# Altium footprint library PedalControl.PcbLib: 12 footprints
Each footprint in its own frame and in the unit in brackets; x right, y up, seen from the top. Pads: shape width x height; smd on the part's side, far side on the other; paste and mask are expansions set on the pad; w line width, h text height; cw(c..) or ccw(c..) is an arc to the next point about the centre after c.
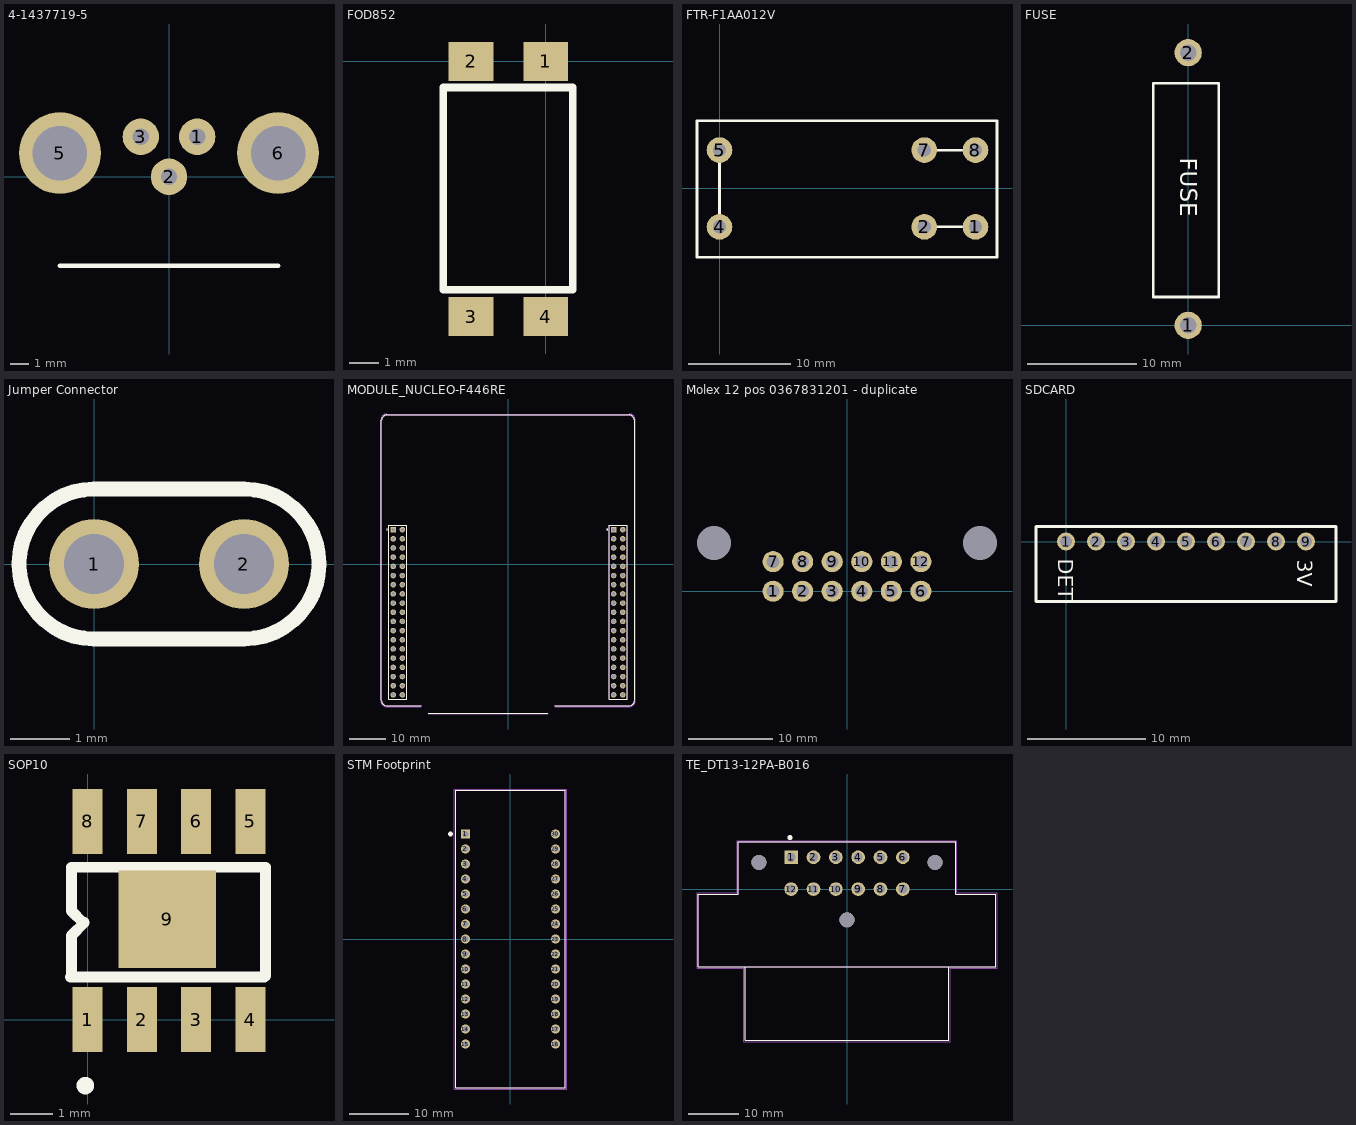
[diagram p0: the footprints below, top view; thin cyan lines are the x and y axes]

## 4-1437719-5 [mm]
pads (5):
  round 2 hole 0.9: 1(1.55,2.2) 2(0,0) 3(-1.55,2.2)
  round 4.5 hole 3: 5(-6,1.3) 6(6,1.3)
Top Overlay:
  lines w0.254: -6,-4.9 6,-4.9
3D body "c-4-1437719-5-a color.stp": height 16.08, standoff -2.9, extent -7.497,-19.3 7.497,6.6

## ADP7142ARDZ-5.0 [mm]

## FOD852 [mm]
pads (4):
  rect 1.5x1.3 smd: 1(0,0) 2(-2.5,0) 3(-2.5,-8.55) 4(0,-8.55)
Top Overlay:
  lines w0.254: -3.425,-7.65 0.9,-7.65 0.9,-0.875 -3.425,-0.875 -3.425,-7.65
3D body "DIP4 Gullwing.STEP": height 3.6, standoff 0, extent -3.6,-9.125 1,0.475

## FTR-F1AA012V [mm]
pads (6):
  round 2.5 hole 1.3: 1(25,-3.75) 2(20,-3.75) 4(0,-3.75) 5(0,3.75) 7(20,3.75) 8(25,3.75)
Top Overlay:
  lines w0.254: 0,-3.75 0,3.75 ; 20,-3.75 25,-3.75 ; 20,3.75 25,3.75 ; -2.2,-6.7 27.1,-6.7 27.1,6.6 -2.2,6.6 -2.2,-6.7
3D body "FTR-F1AA012V.stp": height 16.5, standoff -3.3, extent -2.1,-6.55 26.9,6.55

## FUSE [mm]
pads (2):
  round 2.5 hole 1.5: 1(0,0) 2(0,25)
Top Overlay:
  lines w0.254: -3.2,2.6 2.8,2.6 2.8,22.2 -3.2,22.2 -3.2,2.6
  text "FUSE" at -0.746,15.346 h1.52
3D body "Fuse.stp": height 5.59, standoff -1.71, extent -2.587,-0.399 2.587,25.499

## Jumper Connector [mil]
pads (2):
  round 60 hole 40 unplated: 1(0,0) 2(100,0)
Top Overlay:
  lines w10: -50,0 cw(c0,0) 0,50 100,50 cw(c100,0) 150,0 cw(c100,0) 100,-50 0,-50 cw(c0,0) -50,0

## MODULE_NUCLEO-F446RE [mm]
pads (76):
  rect 1.53x1.53 hole 1.02: CN7_1(-31.75,9.51) CN10_1(29.21,9.51)
  round 1.53 hole 1.02: CN7_2(-29.21,9.51) CN7_3(-31.75,6.97) CN7_4(-29.21,6.97) CN7_5(-31.75,4.43) CN7_6(-29.21,4.43) CN7_7(-31.75,1.89) CN7_8(-29.21,1.89) CN7_9(-31.75,-0.65) CN7_10(-29.21,-0.65) CN7_11(-31.75,-3.19) CN7_12(-29.21,-3.19) CN7_13(-31.75,-5.73) CN7_14(-29.21,-5.73) CN7_15(-31.75,-8.27) CN7_16(-29.21,-8.27) CN7_17(-31.75,-10.81) CN7_18(-29.21,-10.81) CN7_19(-31.75,-13.35) CN7_20(-29.21,-13.35) CN7_21(-31.75,-15.89) CN7_22(-29.21,-15.89) CN7_23(-31.75,-18.43) CN7_24(-29.21,-18.43) CN7_25(-31.75,-20.97) CN7_26(-29.21,-20.97) CN7_27(-31.75,-23.51) CN7_28(-29.21,-23.51) CN7_29(-31.75,-26.05) CN7_30(-29.21,-26.05) CN7_31(-31.75,-28.59) CN7_32(-29.21,-28.59) CN7_33(-31.75,-31.13) CN7_34(-29.21,-31.13) CN7_35(-31.75,-33.67) CN7_36(-29.21,-33.67) CN7_37(-31.75,-36.21) CN7_38(-29.21,-36.21) CN10_2(31.75,9.51) CN10_3(29.21,6.97) CN10_4(31.75,6.97) CN10_5(29.21,4.43) CN10_6(31.75,4.43) CN10_7(29.21,1.89) CN10_8(31.75,1.89) CN10_9(29.21,-0.65) CN10_10(31.75,-0.65) CN10_11(29.21,-3.19) CN10_12(31.75,-3.19) CN10_13(29.21,-5.73) CN10_14(31.75,-5.73) CN10_15(29.21,-8.27) CN10_16(31.75,-8.27) CN10_17(29.21,-10.81) CN10_18(31.75,-10.81) CN10_19(29.21,-13.35) CN10_20(31.75,-13.35) CN10_21(29.21,-15.89) CN10_22(31.75,-15.89) CN10_23(29.21,-18.43) CN10_24(31.75,-18.43) CN10_25(29.21,-20.97) CN10_26(31.75,-20.97) CN10_27(29.21,-23.51) CN10_28(31.75,-23.51) CN10_29(29.21,-26.05) CN10_30(31.75,-26.05) CN10_31(29.21,-28.59) CN10_32(31.75,-28.59) CN10_33(29.21,-31.13) CN10_34(31.75,-31.13) CN10_35(29.21,-33.67) CN10_36(31.75,-33.67) CN10_37(29.21,-36.21) CN10_38(31.75,-36.21)
Top Overlay:
  circle w0.2: c27.46,9.51 r0.1
  circle w0.2: c-33.5,9.51 r0.1
  lines w0.127: -24,-39.25 -33.5,-39.25 cw(c-33.5,-37.75) -35,-37.75 -35,39.75 cw(c-33.5,39.75) -33.5,41.25 33.5,41.25 cw(c33.5,39.75) 35,39.75 35,-37.75 cw(c33.5,-37.75) 33.5,-39.25 13,-39.25 ; -22,-41.25 11,-41.25 ; -32.98,-37.48 -27.98,-37.48 -27.98,10.78 -32.98,10.78 -32.98,-37.48 ; 27.98,-37.48 32.98,-37.48 32.98,10.78 27.98,10.78 27.98,-37.48
Mechanical 13:
  circle w0.2: c27.46,9.51 r0.1
  circle w0.2: c-33.5,9.51 r0.1
  lines w0.127: -24,-39.25 -33.5,-39.25 cw(c-33.5,-37.75) -35,-37.75 -35,39.75 cw(c-33.5,39.75) -33.5,41.25 33.5,41.25 cw(c33.5,39.75) 35,39.75 35,-37.75 cw(c33.5,-37.75) 33.5,-39.25 13,-39.25 ; -22,-41.25 11,-41.25 ; -32.98,-37.48 -27.98,-37.48 -27.98,10.78 -32.98,10.78 -32.98,-37.48 ; 27.98,-37.48 32.98,-37.48 32.98,10.78 27.98,10.78 27.98,-37.48
Mechanical 15:
  lines w0.05: -24.125,-39.5 -33.5,-39.5 cw(c-33.5,-37.75) -35.25,-37.75 -35.25,39.75 cw(c-33.5,39.75) -33.5,41.5 33.5,41.5 cw(c33.5,39.75) 35.25,39.75 35.25,-37.75 cw(c33.5,-37.75) 33.5,-39.5 13.125,-39.5 ; -22.125,-41.5 11.125,-41.5
3D body "step_temp.STEP": height 14.82, standoff -5.88, extent -35,-41.25 35,42.7

## Molex 12 pos 0367831201 - duplicate [mm]
pads (14):
  round 2.5 hole 1.5: 1(-8.75,0) 2(-5.25,0) 3(-1.75,0) 4(1.75,0) 5(5.25,0) 6(8.75,0) 7(-8.75,3.5) 8(-5.25,3.5) 9(-1.75,3.5) 10(1.75,3.5) 11(5.25,3.5) 12(8.75,3.5)
  round 3 hole 4: ""(-15.75,5.7) ""(15.75,5.7)
3D body "367831201.stp": height 24.48, standoff -3.14, extent -18.758,-0.304 18.6,32.154

## SDCARD [mil]
pads (9):
  round 60 hole 40 unplated: 1(0,0) 2(100,0) 3(200,0) 4(300,0) 5(400,0) 6(500,0) 7(600,0) 8(700,0) 9(800,0)
Top Overlay:
  lines w10: -100,-200 900,-200 900,50 -100,50 -100,-200
  text "DET" at -26,-57 h50
  text "3V" at 770,-60 h50
3D body "SDREADER.stp": height 1034.68, standoff -253.24, extent -100,-197.64 900,50

## SOP10 [mm]
pads (9):
  rect 0.7x1.524 smd: 1(0,0) 2(1.275,0) 3(2.55,0) 4(3.825,0) 5(3.825,4.65) 6(2.55,4.65) 7(1.275,4.65) 8(0,4.65)
  rect 2.29x2.29 smd: 9(1.875,2.35)
Top Overlay:
  circle w0.254: c-0.05,-1.55 r0.079
  lines w0.254: -0.4,1 -0.375,1.025 -0.375,1.975 -0.075,2.275 -0.1,2.275 -0.375,2.55 -0.375,3.575 4.175,3.575 4.175,1.025 4.15,1 -0.4,1

## STM Footprint [mm]
pads (30):
  rect 1.53x1.53 hole 1.02: 1(-7.62,17.78)
  round 1.53 hole 1.02: 2(-7.62,15.24) 3(-7.62,12.7) 4(-7.62,10.16) 5(-7.62,7.62) 6(-7.62,5.08) 7(-7.62,2.54) 8(-7.62,0) 9(-7.62,-2.54) 10(-7.62,-5.08) 11(-7.62,-7.62) 12(-7.62,-10.16) 13(-7.62,-12.7) 14(-7.62,-15.24) 15(-7.62,-17.78) 16(7.62,-17.78) 17(7.62,-15.24) 18(7.62,-12.7) 19(7.62,-10.16) 20(7.62,-7.62) 21(7.62,-5.08) 22(7.62,-2.54) 23(7.62,0) 24(7.62,2.54) 25(7.62,5.08) 26(7.62,7.62) 27(7.62,10.16) 28(7.62,12.7) 29(7.62,15.24) 30(7.62,17.78)
Top Overlay:
  circle w0.4: c-10.16,17.78 r0.2
  lines w0.127: -9.27,-25.145 9.27,-25.145 9.27,25.145 -9.27,25.145 -9.27,-25.145
Mechanical 13:
  circle w0.4: c-10.16,17.78 r0.2
  lines w0.127: -9.27,-25.145 9.27,-25.145 9.27,25.145 -9.27,25.145 -9.27,-25.145
Mechanical 15:
  lines w0.05: -9.52,-25.395 9.52,-25.395 9.52,25.395 -9.52,25.395 -9.52,-25.395
3D body "NUCLEO-F303K8--3DModel-STEP-56544.STEP": height 8.51, standoff -5.99, extent -9.274,-24.295 9.271,27.708

## TE_DT13-12PA-B016 [mm]
pads (15):
  rect 2.715x2.715 hole 1.81: 1(-11.115,6.35)
  round 2.715 hole 1.81: 2(-6.67,6.35) 3(-2.225,6.35) 4(2.225,6.35) 5(6.67,6.35) 6(11.115,6.35) 7(11.115,0) 8(6.67,0) 9(2.225,0) 10(-2.225,0) 11(-6.67,0) 12(-11.115,0)
  round 2.99 hole 2.99 unplated: ""(-17.54,5.34) ""(0,-6.1) ""(17.54,5.34)
Top Overlay:
  circle w0.5: c-11.35,10.25 r0.25
  lines w0.127: -20.28,-15.49 -20.28,-30.1 20.28,-30.1 20.28,-15.49 ; -20.28,-15.49 -29.605,-15.49 -29.605,-1 -21.605,-1 -21.605,9.4 21.605,9.4 21.605,-1 29.605,-1 29.605,-15.49 20.28,-15.49 ; -20.28,-15.49 20.28,-15.49
Mechanical 13:
  lines w0.127: -20.28,-15.49 -20.28,-30.1 20.28,-30.1 20.28,-15.49 ; -20.28,-15.49 -29.605,-15.49 -29.605,-1 -21.605,-1 -21.605,9.4 21.605,9.4 21.605,-1 29.605,-1 29.605,-15.49 20.28,-15.49 ; -20.28,-15.49 20.28,-15.49
Mechanical 15:
  lines w0.05: -29.855,-15.74 -29.855,-0.75 -21.85,-0.75 -21.85,9.65 21.85,9.65 21.85,-0.7 29.855,-0.7 29.855,-15.74 20.53,-15.74 20.53,-30.35 -20.53,-30.35 -20.53,-15.74 -29.855,-15.74
3D body "c-dt13-12pa-b016-a-3d.stp": height 35.65, standoff -2.98, extent -29.591,-34.798 29.591,9.525